# Altium footprint library microbuilder.PCBLIB: 422 footprints (part 20 of 27)
Each footprint in its own frame and in the unit in brackets; x right, y up, seen from the top. Pads: shape width x height; smd on the part's side, far side on the other; paste and mask are expansions set on the pad; w line width, h text height; cw(c..) or ccw(c..) is an arc to the next point about the centre after c.
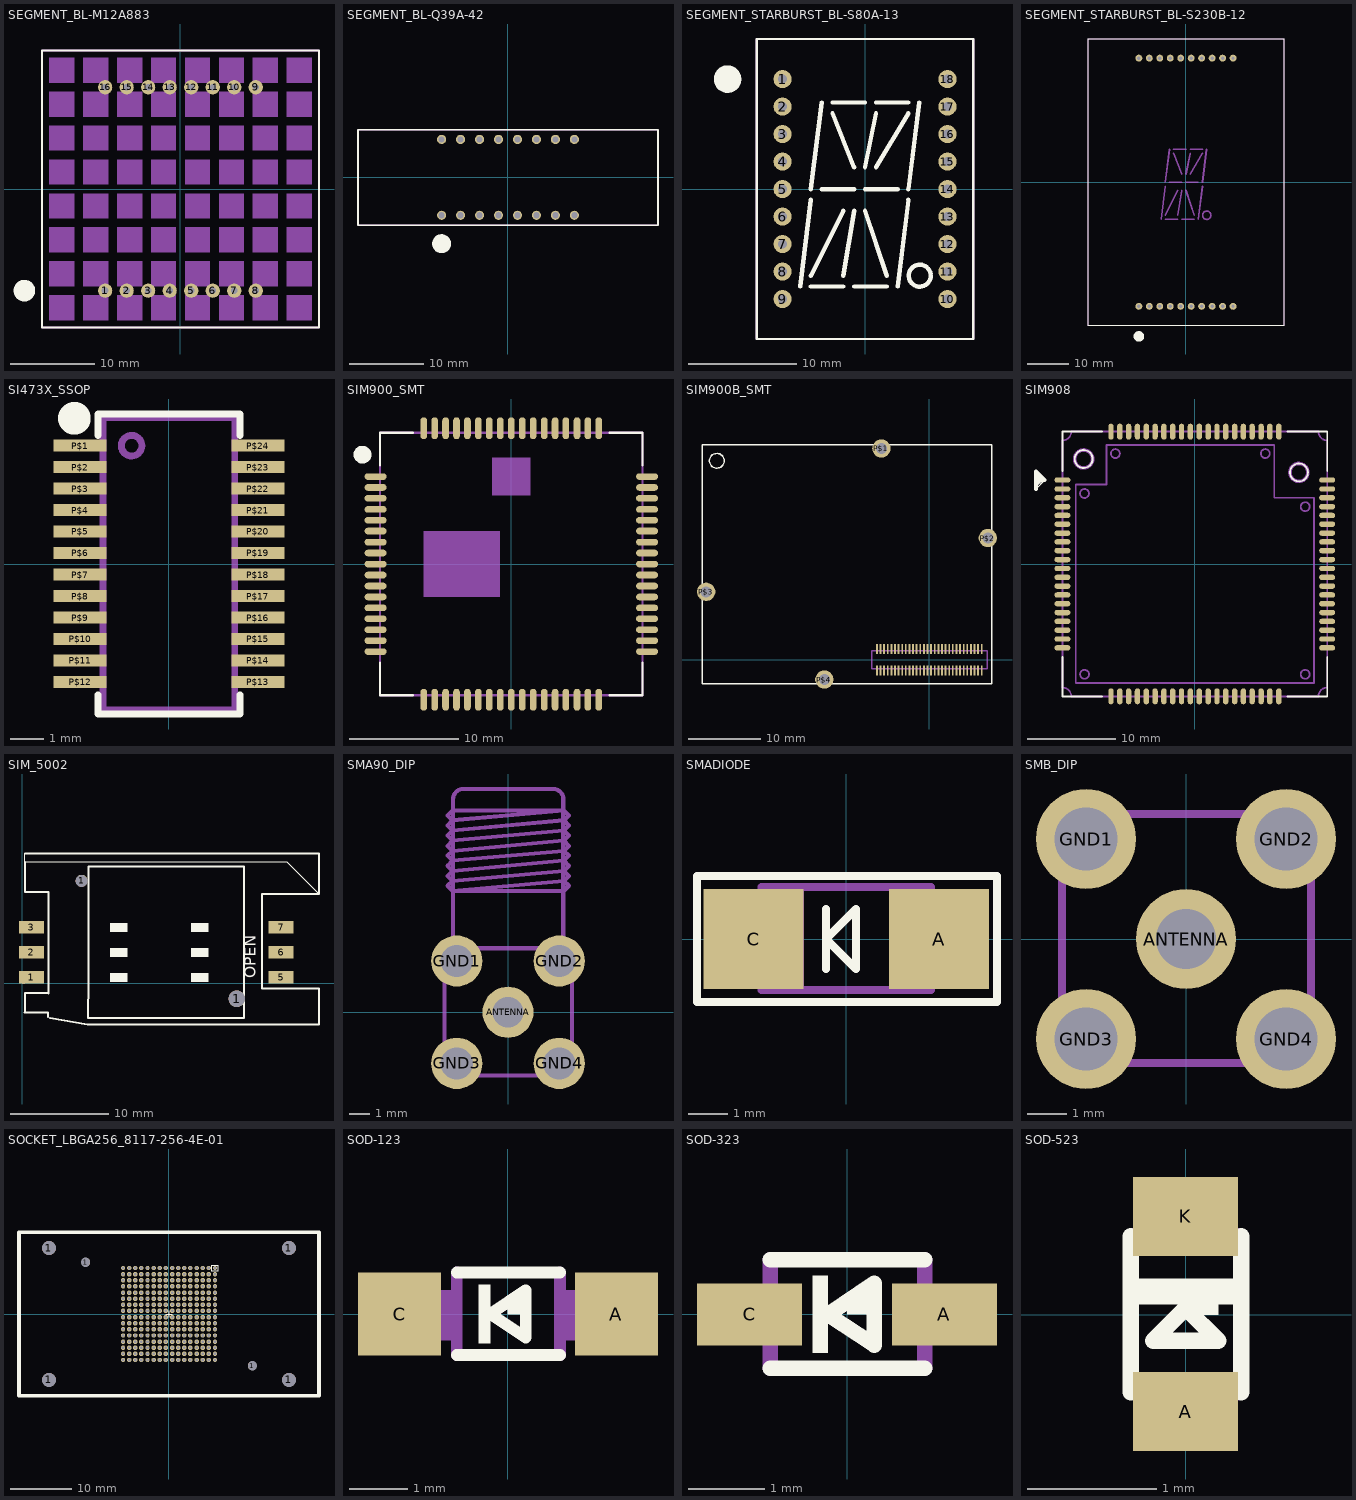
[diagram p19: the footprints below, top view; thin cyan lines are the x and y axes]

## SEGMENT_BL-M12A883 [mil]
pads (16):
  round 66 hole 32: 1(-350,-472.44) 2(-250,-472.44) 3(-150,-472.44) 4(-50,-472.44) 5(50,-472.44) 6(150,-472.44) 7(250,-472.44) 8(350,-472.44) 9(350,473) 10(250,473) 11(150,473) 12(50,473) 13(-50,473) 14(-150,473) 15(-250,473) 16(-350,473)
Top Overlay:
  circle w50: c-725.59,-472.44 r25
  lines w8: -643.7,-643.7 644,-643.7 644,644 -643.7,644 -643.7,-643.7
Mechanical 16:
  rectangle: -610.24,493 -492.13,611
  rectangle: -452.76,493 -334.65,611
  rectangle: -295.28,493 -177.17,611
  rectangle: -137.8,493 -19.68,611
  rectangle: 20,493 138,611
  rectangle: 178,493 296,611
  rectangle: 335,493 453,611
  rectangle: 493,493 611,611
  rectangle: 493,335 611,453
  rectangle: 335,335 453,453
  rectangle: 178,335 296,453
  rectangle: 20,335 138,453
  rectangle: -137.8,335 -19.68,453
  rectangle: -295.28,335 -177.17,453
  rectangle: -610.24,335 -492.13,453
  rectangle: -452.76,335 -334.65,453
  rectangle: -610.24,178 -492.13,296
  rectangle: -452.76,178 -334.65,296
  rectangle: -295.28,178 -177.17,296
  rectangle: -137.8,178 -19.68,296
  rectangle: 20,178 138,296
  rectangle: 178,178 296,296
  rectangle: 335,178 453,296
  rectangle: 493,178 611,296
  rectangle: 493,20 611,138
  rectangle: 493,-137.8 611,-19.68
  rectangle: 335,-137.8 453,-19.68
  rectangle: 335,20 453,138
  rectangle: 178,20 296,138
  rectangle: 20,20 138,138
  rectangle: -137.8,20 -19.68,138
  rectangle: -295.28,20 -177.17,138
  rectangle: -452.76,20 -334.65,138
  rectangle: -610.24,20 -492.13,138
  rectangle: -610.24,-137.8 -492.13,-19.68
  rectangle: -452.76,-137.8 -334.65,-19.68
  rectangle: -295.28,-137.8 -177.17,-19.68
  rectangle: -137.8,-137.8 -19.68,-19.68
  rectangle: 20,-137.8 138,-19.68
  rectangle: 178,-137.8 296,-19.68
  rectangle: 493,-295.28 611,-177.17
  rectangle: 335,-295.28 453,-177.17
  rectangle: -610.24,-295.28 -492.13,-177.17
  rectangle: -452.76,-295.28 -334.65,-177.17
  rectangle: -295.28,-295.28 -177.17,-177.17
  rectangle: -137.8,-295.28 -19.68,-177.17
  rectangle: 20,-295.28 138,-177.17
  rectangle: 178,-295.28 296,-177.17
  rectangle: 493,-452.76 611,-334.65
  rectangle: 335,-452.76 453,-334.65
  rectangle: -610.24,-452.76 -492.13,-334.65
  rectangle: -452.76,-452.76 -334.65,-334.65
  rectangle: -295.28,-452.76 -177.17,-334.65
  rectangle: -137.8,-452.76 -19.68,-334.65
  rectangle: 20,-452.76 138,-334.65
  rectangle: 178,-452.76 296,-334.65
  rectangle: 493,-610.24 611,-492.13
  rectangle: 335,-610.24 453,-492.13
  rectangle: -610.24,-610.24 -492.13,-492.13
  rectangle: -452.76,-610.24 -334.65,-492.13
  rectangle: -295.28,-610.24 -177.17,-492.13
  rectangle: -137.8,-610.24 -19.68,-492.13
  rectangle: 20,-610.24 138,-492.13
  rectangle: 178,-610.24 296,-492.13
  lines w8: -643.7,-643.7 644,-643.7 644,644 -643.7,644 -643.7,-643.7

## SEGMENT_BL-Q39A-42 [mil]
pads (16):
  round 48 hole 32: P$1(-350,-200) P$2(-250,-200) P$3(-150,-200) P$4(-50,-200) P$5(50,-200) P$6(150,-200) P$7(250,-200) P$8(350,-200) P$9(350,200) P$10(250,200) P$11(150,200) P$12(50,200) P$13(-50,200) P$14(-150,200) P$15(-250,200) P$16(-350,200)
Top Overlay:
  circle w50: c-350,-350 r25
  lines w8: -790.94,-251.97 791,-251.97 791,252 -790.94,252 -790.94,-251.97
Mechanical 16:
  lines w5: -790.94,-251.97 791,-251.97 791,252 -790.94,252 -790.94,-251.97

## SEGMENT_STARBURST_BL-S80A-13 [mil]
pads (18):
  round 66 hole 32: 1(-300,400) 2(-300,300) 3(-300,200) 4(-300,100) 5(-300,0) 6(-300,-100) 7(-300,-200) 8(-300,-300) 9(-300,-400) 10(300,-400) 11(300,-300) 12(300,-200) 13(300,-100) 14(300,0) 15(300,100) 16(300,200) 17(300,300) 18(300,400)
Top Overlay:
  circle w16: c199,-314.96 r40
  circle w50: c-500,400 r25
  lines w8: -393.7,-545.28 394,-545.28 394,546 -393.7,546 -393.7,-545.28
  lines w16: -236.22,-354.33 -196.85,-39.37 ; -196.85,-354.33 -78.74,-354.33 ; -196.85,-314.96 -78.74,-78.74 ; -196.85,0 -157.48,315 ; -157.48,0 -39.37,0 ; -118.11,276 -39.37,79 ; -118.11,315 0,315 ; -78.74,-314.96 -39.37,-78.74 ; -39.37,-354.33 79,-354.33 ; 0,-78.74 79,-314.96 ; 0,0 119,0 ; 0,79 40,276 ; 40,79 158,276 ; 40,315 158,315 ; 119,-354.33 158,-39.37 ; 158,0 197,315
Mechanical 16:
  lines w8: -393.7,-545.28 394,-545.28 394,546 -393.7,546 -393.7,-545.28
  text "A1" at -78.74,335 h62
  text "A2" at 79,335 h62
  text "D1" at -177.17,-413.39 h62
  text "D2" at -19.68,-413.39 h62
  text "E" at -275.59,-196.85 h62
  text "F" at -236.22,158 h62
  text "B" at 217,158 h62
  text "C" at 178,-196.85 h62
  text "G1" at -118.11,20 h62
  text "G2" at 40,20 h62
  text "L" at 40,-118.11 h62
  text "M" at -39.37,-236.22 h62
  text "N" at -137.8,-118.11 h62
  text "J" at -19.68,197 h62
  text "K" at 119,138 h62
  text "H" at -118.11,138 h62
  text "DP" at 167,-413.39 h62

## SEGMENT_STARBURST_BL-S230B-12 [mil]
pads (20):
  round 66 hole 32: 1(-450,-1185.04) 2(-350,-1185.04) 3(-250,-1185.04) 4(-150,-1185.04) 5(-50,-1185.04) 6(50,-1185.04) 7(150,-1185.04) 8(250,-1185.04) 9(350,-1185.04) 10(450,-1185.04) 11(450,1186) 12(350,1186) 13(250,1186) 14(150,1186) 15(50,1186) 16(-50,1186) 17(-150,1186) 18(-250,1186) 19(-350,1186) 20(-450,1186)
Top Overlay:
  circle w50: c-450,-1472.44 r25
  lines w8: -937.01,-1368.11 -937.01,1369 938,1369 938,-1368.11 -937.01,-1368.11
Mechanical 16:
  circle w16: c199,-314.96 r40
  lines w8: -937.01,-1368.11 -937.01,1369 938,1369 938,-1368.11 -937.01,-1368.11
  lines w16: -236.22,-354.33 -196.85,-39.37 ; -196.85,-354.33 -78.74,-354.33 ; -196.85,-314.96 -78.74,-78.74 ; -196.85,0 -157.48,315 ; -157.48,0 -39.37,0 ; -118.11,276 -39.37,79 ; -118.11,315 0,315 ; -78.74,-314.96 -39.37,-78.74 ; -39.37,-354.33 79,-354.33 ; 0,-78.74 79,-314.96 ; 0,0 119,0 ; 0,79 40,276 ; 40,79 158,276 ; 40,315 158,315 ; 119,-354.33 158,-39.37 ; 158,0 197,315
  text "A1" at -78.74,335 h62
  text "A2" at 79,335 h62
  text "D1" at -177.17,-413.39 h62
  text "D2" at -19.68,-413.39 h62
  text "F" at -236.22,158 h62
  text "B" at 217,158 h62
  text "C" at 178,-196.85 h62
  text "G1" at -118.11,20 h62
  text "G2" at 40,20 h62
  text "L" at 40,-118.11 h62
  text "M" at -39.37,-236.22 h62
  text "N" at -137.8,-118.11 h62
  text "J" at -19.68,197 h62
  text "K" at 119,138 h62
  text "H" at -118.11,138 h62
  text "DP" at 167,-413.39 h62

## SI473X_SSOP [mil]
pads (24):
  rect 62x14 smd: P$1(-103.35,138) P$2(-103.35,113) P$3(-103.35,88) P$4(-103.35,63) P$5(-103.35,38) P$6(-103.35,13) P$7(-103.35,-12.5) P$8(-103.35,-37.5) P$9(-103.35,-62.5) P$10(-103.35,-87.5) P$11(-103.35,-112.5) P$12(-103.35,-137.5) P$13(104,-137.5) P$14(104,-112.5) P$15(104,-87.5) P$16(104,-62.5) P$17(104,-37.5) P$18(104,-12.5) P$19(104,13) P$20(104,38) P$21(104,63) P$22(104,88) P$23(104,113) P$24(104,138)
Top Overlay:
  circle w32: c-110,170 r3
  lines w8: -82.5,-152.5 -82.5,-175 83,-175 83,-152.5 ; -82.5,150 -82.5,175 -80,175 83,175 83,150
Mechanical 16:
  circle w8: c-43.31,138 r12
  lines w8: -76.77,-170.28 77,-170.28 77,171 -76.77,171 -76.77,-170.28

## SIM900_SMT [mil]
pads (68):
  rrect100% 79x24 smd: P$1(-488.19,315) P$2(-488.19,276) P$3(-488.19,237) P$4(-488.19,197) P$5(-488.19,158) P$6(-488.19,119) P$7(-488.19,79) P$8(-488.19,40) P$9(-488.19,0) P$10(-488.19,-39.37) P$11(-488.19,-78.74) P$12(-488.19,-118.11) P$13(-488.19,-157.48) P$14(-488.19,-196.85) P$15(-488.19,-236.22) P$16(-488.19,-275.59) P$17(-488.19,-314.96) P$35(489,-314.96) P$36(489,-275.59) P$37(489,-236.22) P$38(489,-196.85) P$39(489,-157.48) P$40(489,-118.11) P$41(489,-78.74) P$42(489,-39.37) P$43(489,0) P$44(489,40) P$45(489,79) P$46(489,119) P$47(489,158) P$48(489,197) P$49(489,237) P$50(489,276) P$51(489,315)
  rrect100% 24x79 smd: P$18(-314.96,-488.19) P$19(-275.59,-488.19) P$20(-236.22,-488.19) P$21(-196.85,-488.19) P$22(-157.48,-488.19) P$23(-118.11,-488.19) P$24(-78.74,-488.19) P$25(-39.37,-488.19) P$26(0,-488.19) P$27(40,-488.19) P$28(79,-488.19) P$29(119,-488.19) P$30(158,-488.19) P$31(197,-488.19) P$32(237,-488.19) P$33(276,-488.19) P$34(315,-488.19) P$52(315,489) P$53(276,489) P$54(237,489) P$55(197,489) P$56(158,489) P$57(119,489) P$58(79,489) P$59(40,489) P$60(0,489) P$61(-39.37,489) P$62(-78.74,489) P$63(-118.11,489) P$64(-157.48,489) P$65(-196.85,489) P$66(-236.22,489) P$67(-275.59,489) P$68(-314.96,489)
Top Overlay:
  circle w32: c-535.43,394 r16
  lines w8: -472.44,-354.33 -472.44,-472.44 -354.33,-472.44 ; -472.44,355 -472.44,473 -354.33,473 ; 355,-472.44 473,-472.44 473,-354.33 ; 355,473 473,473 473,355
Mechanical 16:
  lines w8: -472.44,-472.44 -472.44,473 473,473 473,-472.44 -472.44,-472.44
Mechanical 27:
  rectangle: -314.96,-118.11 -39.37,119
  rectangle: -68.9,247 69,384

## SIM900B_SMT [mil]
pads (64):
  rect 10x54 smd: 1(-285.43,-58.07) 2(-285.43,59) 3(-265.75,-58.07) 4(-265.75,59) 5(-246.06,-58.07) 6(-246.06,59) 7(-226.38,-58.07) 8(-226.38,59) 9(-206.69,-58.07) 10(-206.69,59) 11(-187.01,-58.07) 12(-187.01,59) 13(-167.32,-58.07) 14(-167.32,59) 15(-147.64,-58.07) 16(-147.64,59) 17(-127.95,-58.07) 18(-127.95,59) 19(-108.27,-58.07) 20(-108.27,59) 21(-88.58,-58.07) 22(-88.58,59) 23(-68.9,-58.07) 24(-68.9,59) 25(-49.21,-58.07) 26(-49.21,59) 27(-29.53,-58.07) 28(-29.53,59) 29(-9.84,-58.07) 30(-9.84,59) 31(10,-58.07) 32(10,59) 33(30,-58.07) 34(30,59) 35(50,-58.07) 36(50,59) 37(69,-58.07) 38(69,59) 39(89,-58.07) 40(89,59) 41(109,-58.07) 42(109,59) 43(128,-58.07) 44(128,59) 45(148,-58.07) 46(148,59) 47(168,-58.07) 48(168,59) 49(188,-58.07) 50(188,59) 51(207,-58.07) 52(207,59) 53(227,-58.07) 54(227,59) 55(247,-58.07) 56(247,59) 57(266,-58.07) 58(266,59) 59(286,-58.07) 60(286,59)
  round 100 hole 60: P$1(-261.02,1152) P$2(319,664) P$3(-1216.14,371) P$4(-572.05,-107.09)
Top Overlay:
  circle w8: c-1158.27,1085 r40
  lines w8: -1238.19,-131.5 341,-131.5 341,1172 -1238.19,1172 -1238.19,-131.5
Mechanical 16:
  lines w8: -314.96,-49.21 315,-49.21 315,50 -314.96,50 -314.96,-49.21

## SIM908 [mil]
pads (80):
  rrect100% 71x24 smd: P$1(-590.55,375) P$2(-590.55,335) P$3(-590.55,296) P$4(-590.55,256) P$5(-590.55,217) P$6(-590.55,178) P$7(-590.55,138) P$8(-590.55,99) P$9(-590.55,60) P$10(-590.55,20) P$11(-590.55,-19.68) P$12(-590.55,-59.06) P$13(-590.55,-98.43) P$14(-590.55,-137.8) P$15(-590.55,-177.17) P$16(-590.55,-216.54) P$17(-590.55,-255.91) P$18(-590.55,-295.28) P$19(-590.55,-334.65) P$20(-590.55,-374.02) P$41(591,-374.02) P$42(591,-334.65) P$43(591,-295.28) P$44(591,-255.91) P$45(591,-216.54) P$46(591,-177.17) P$47(591,-137.8) P$48(591,-98.43) P$49(591,-59.06) P$50(591,-19.68) P$51(591,20) P$52(591,60) P$53(591,99) P$54(591,138) P$55(591,178) P$56(591,217) P$57(591,256) P$58(591,296) P$59(591,335) P$60(591,375)
  rrect100% 24x71 smd: P$21(-374.02,-590.55) P$22(-334.65,-590.55) P$23(-295.28,-590.55) P$24(-255.91,-590.55) P$25(-216.54,-590.55) P$26(-177.17,-590.55) P$27(-137.8,-590.55) P$28(-98.43,-590.55) P$29(-59.06,-590.55) P$30(-19.68,-590.55) P$31(20,-590.55) P$32(60,-590.55) P$33(99,-590.55) P$34(138,-590.55) P$35(178,-590.55) P$36(217,-590.55) P$37(256,-590.55) P$38(296,-590.55) P$39(335,-590.55) P$40(375,-590.55) P$61(375,591) P$62(335,591) P$63(296,591) P$64(256,591) P$65(217,591) P$66(178,591) P$67(138,591) P$68(99,591) P$69(60,591) P$70(20,591) P$71(-19.68,591) P$72(-59.06,591) P$73(-98.43,591) P$74(-137.8,591) P$75(-177.17,591) P$76(-216.54,591) P$77(-255.91,591) P$78(-295.28,591) P$79(-334.65,591) P$80(-374.02,591)
Top Overlay:
  circle w8: c-496.06,469 r40
  circle w8: c465,409 r40
  lines w8: -708.66,335 -669.29,375 ; -590.55,-413.39 -590.55,-590.55 -413.39,-590.55 ; -590.55,414 -590.55,591 -413.39,591 ; 414,-590.55 591,-590.55 591,-413.39 ; 414,591 591,591 591,414
  lines w16: -708.66,335 -708.66,355 ; -708.66,355 -688.98,375 ; -708.66,355 -708.66,394 ; -708.66,394 -708.66,414 -669.29,375 -688.98,375 ; -708.66,394 -688.98,375
Mechanical 16:
  circle w8: c-492.13,315 r20
  circle w8: c-354.33,493 r20
  circle w8: c315,493 r20
  circle w8: c493,256 r20
  circle w8: c-492.13,-492.13 r20
  circle w8: c493,-492.13 r20
  circle w16: c-496.06,469 r40
  circle w16: c465,409 r40
  lines w8: -590.55,-551.18 -590.55,552 ccw(c-590.37,591.18) -551.18,591 552,591 ccw(c591,591) 591,552 591,-551.18 ccw(c591.18,-590.37) 552,-590.55 -551.18,-590.55 ccw(c-590.55,-590.55) -590.55,-551.18 ; -531.5,-531.5 532,-531.5 532,296 355,296 355,532 -393.7,532 -393.7,355 -531.5,355 -531.5,-531.5

## SIM_5002 [mil]
pads (8):
  rect 100x50 smd: 1(36,23) 2(36,123) 3(36,223) 5(1036,24) 6(1036,124) 7(1036,224)
  round 48 hole 48: 1(237,410)
  round 67 hole 67: 1(859,-62.99)
Top Overlay:
  rectangle: 351,5 421,40
  rectangle: 351,105 421,140
  rectangle: 351,205 421,240
  rectangle: 676,5 746,40
  rectangle: 676,105 746,140
  rectangle: 676,205 746,240
  region: 0,0 10,0 10,10 0,10
  region: 0,0 10,0 10,10 0,10
  region: 0,0 10,0 10,10 0,10
  lines w5: 10,519 10,485 1060,485 1185,360
  lines w8: 9,-117.94 103,-117.68 103,-136.17 ; 10,-115 10,-40 105,-40 ; 10,485 10,365 105,365 105,13 105,-40 ; 10,519 64,519 ; 63,519 1025,519 1187,519 ; 105,-41.11 105,-40 ; 110,-140 260,-165 1188,-165 ; 960,10 960,358 1188,358 1188,519 ; 960,14 960,-21.12 1188,-21.12 1188,-165.54 ; 263,-139.25 264,11 264,468 887,468 887,-140 263,-139.25
  text "OPEN" at 950,19 h77.5

## SMA90_DIP [mil]
pads (5):
  round 100 hole 60: ANTENNA(0,0)
  round 100 hole 63: GND1(-100,100) GND2(100,100) GND3(-100,-100) GND4(100,-100)
Mechanical 16:
  lines w8: -107.28,125 -107.28,416 ; -107.09,416 cw(c-87.54,416.45) -87.99,436 ; -87.6,436 88,436 ; 89,436 cw(c88.5,416.5) 108,416 108,125 ; -108.27,237 -118.11,247 -108.27,256 ; -108.27,237 109,256 ; -108.27,237 109,237 119,247 109,256 ; -108.27,256 -118.11,266 -108.27,276 ; -108.27,256 109,276 ; -108.27,276 -118.11,286 -108.27,296 ; -108.27,276 109,296 ; -108.27,296 -118.11,306 -108.27,315 ; -108.27,296 109,315 ; -108.27,315 -118.11,325 -108.27,335 ; -108.27,315 109,335 ; -108.27,335 -118.11,345 -108.27,355 ; -108.27,335 109,355 ; -108.27,355 -118.11,365 -108.27,375 ; -108.27,355 109,375 ; -108.27,375 -118.11,384 -108.27,394 109,394 ; -108.27,375 109,394 ; 109,256 119,266 109,276 ; 109,276 119,286 109,296 ; 109,296 119,306 109,315 ; 109,315 119,325 109,335 ; 109,335 119,345 109,355 ; 109,355 119,365 109,375 ; 109,375 119,384 109,394 ; -124.02,-99.21 ccw(c-99.21,-99.21) -99.21,-124.02 100,-124.02 ccw(c100.1,-99.11) 125,-99.21 125,100 ccw(c100,100) 100,125 -99.21,125 ccw(c-99.11,100.1) -124.02,100 -124.02,-99.21

## SMADIODE [mil]
pads (2):
  rect 100x100 smd: A(93,0) C(-92.5,0)
Top Overlay:
  lines w5: -149.17,-54.88 -149.17,-45.12 ; 151,53 151,55
  lines w8: -20,-30 -20,0 ; -20,30 -20,0 ; -20,0 10,-30 10,30 -20,0 ; -149.17,-62.99 151,-62.99 151,55 151,63 -149.17,63 -149.17,-45.12 -149.17,-62.99
Mechanical 16:
  rectangle: -111.22,-43.31 -85.63,44
  region: 112,44 86,44 86,-43.31 112,-43.31
  rectangle: -68.9,-48.23 -42.32,49
  lines w8: -84.65,-51.18 85,-51.18 85,52 -84.65,52 -84.65,-51.18

## SMB_DIP [mil]
pads (5):
  round 100 hole 60: ANTENNA(0,0)
  round 100 hole 63: GND1(-100,100) GND2(100,100) GND3(-100,-100) GND4(100,-100)
Mechanical 16:
  lines w8: -124.02,-99.21 ccw(c-99.21,-99.21) -99.21,-124.02 100,-124.02 ccw(c100.1,-99.11) 125,-99.21 125,100 ccw(c100,100) 100,125 -99.21,125 ccw(c-99.11,100.1) -124.02,100 -124.02,-99.21

## SOCKET_LBGA256_8117-256-4E-01 [mil]
pads (262):
  round 89 hole 89: 1(-771.65,-423.23) 1(-771.65,424) 1(772,-423.23) 1(772,424)
  round 58 hole 58: 1(-535.43,333) 1(536,-332.68)
  oct 28x28 hole 17: A1(296,296) A2(296,256) A3(296,217) A4(296,178) A5(296,138) A6(296,99) A7(296,60) A8(296,20) A9(296,-19.68) A10(296,-59.06) A11(296,-98.43) A12(296,-137.8) A13(296,-177.17) A14(296,-216.54) A15(296,-255.91) A16(296,-295.28) B1(256,296) B2(256,256) B3(256,217) B4(256,178) B5(256,138) B6(256,99) B7(256,60) B8(256,20) B9(256,-19.68) B10(256,-59.06) B11(256,-98.43) B12(256,-137.8) B13(256,-177.17) B14(256,-216.54) B15(256,-255.91) B16(256,-295.28) C1(217,296) C2(217,256) C3(217,217) C4(217,178) C5(217,138) C6(217,99) C7(217,60) C8(217,20) C9(217,-19.68) C10(217,-59.06) C11(217,-98.43) C12(217,-137.8) C13(217,-177.17) C14(217,-216.54) C15(217,-255.91) C16(217,-295.28) D1(178,296) D2(178,256) D3(178,217) D4(178,178) D5(178,138) D6(178,99) D7(178,60) D8(178,20) D9(178,-19.68) D10(178,-59.06) D11(178,-98.43) D12(178,-137.8) D13(178,-177.17) D14(178,-216.54) D15(178,-255.91) D16(178,-295.28) E1(138,296) E2(138,256) E3(138,217) E4(138,178) E5(138,138) E6(138,99) E7(138,60) E8(138,20) E9(138,-19.68) E10(138,-59.06) E11(138,-98.43) E12(138,-137.8) E13(138,-177.17) E14(138,-216.54) E15(138,-255.91) E16(138,-295.28) F1(99,296) F2(99,256) F3(99,217) F4(99,178) F5(99,138) F6(99,99) F7(99,60) F8(99,20) F9(99,-19.68) F10(99,-59.06) F11(99,-98.43) F12(99,-137.8) F13(99,-177.17) F14(99,-216.54) F15(99,-255.91) F16(99,-295.28) G1(60,296) G2(60,256) G3(60,217) G4(60,178) G5(60,138) G6(60,99) G7(60,60) G8(60,20) G9(60,-19.68) G10(60,-59.06) G11(60,-98.43) G12(60,-137.8) G13(60,-177.17) G14(60,-216.54) G15(60,-255.91) G16(60,-295.28) H1(20,296) H2(20,256) H3(20,217) H4(20,178) H5(20,138) H6(20,99) H7(20,60) H8(20,20) H9(20,-19.68) H10(20,-59.06) H11(20,-98.43) H12(20,-137.8) H13(20,-177.17) H14(20,-216.54) H15(20,-255.91) H16(20,-295.28) J1(-19.68,296) J2(-19.68,256) J3(-19.68,217) J4(-19.68,178) J5(-19.68,138) J6(-19.68,99) J7(-19.68,60) J8(-19.68,20) J9(-19.68,-19.68) J10(-19.68,-59.06) J11(-19.68,-98.43) J12(-19.68,-137.8) J13(-19.68,-177.17) J14(-19.68,-216.54) J15(-19.68,-255.91) J16(-19.68,-295.28) K1(-59.06,296) K2(-59.06,256) K3(-59.06,217) K4(-59.06,178) K5(-59.06,138) K6(-59.06,99) K7(-59.06,60) K8(-59.06,20) K9(-59.06,-19.68) K10(-59.06,-59.06) K11(-59.06,-98.43) K12(-59.06,-137.8) K13(-59.06,-177.17) K14(-59.06,-216.54) K15(-59.06,-255.91) K16(-59.06,-295.28) L1(-98.43,296) L2(-98.43,256) L3(-98.43,217) L4(-98.43,178) L5(-98.43,138) L6(-98.43,99) L7(-98.43,60) L8(-98.43,20) L9(-98.43,-19.68) L10(-98.43,-59.06) L11(-98.43,-98.43) L12(-98.43,-137.8) L13(-98.43,-177.17) L14(-98.43,-216.54) L15(-98.43,-255.91) L16(-98.43,-295.28) M1(-137.8,296) M2(-137.8,256) M3(-137.8,217) M4(-137.8,178) M5(-137.8,138) M6(-137.8,99) M7(-137.8,60) M8(-137.8,20) M9(-137.8,-19.68) M10(-137.8,-59.06) M11(-137.8,-98.43) M12(-137.8,-137.8) M13(-137.8,-177.17) M14(-137.8,-216.54) M15(-137.8,-255.91) M16(-137.8,-295.28) N1(-177.17,296) N2(-177.17,256) N3(-177.17,217) N4(-177.17,178) N5(-177.17,138) N6(-177.17,99) N7(-177.17,60) N8(-177.17,20) N9(-177.17,-19.68) N10(-177.17,-59.06) N11(-177.17,-98.43) N12(-177.17,-137.8) N13(-177.17,-177.17) N14(-177.17,-216.54) N15(-177.17,-255.91) N16(-177.17,-295.28) P1(-216.54,296) P2(-216.54,256) P3(-216.54,217) P4(-216.54,178) P5(-216.54,138) P6(-216.54,99) P7(-216.54,60) P8(-216.54,20) P9(-216.54,-19.68) P10(-216.54,-59.06) P11(-216.54,-98.43) P12(-216.54,-137.8) P13(-216.54,-177.17) P14(-216.54,-216.54) P15(-216.54,-255.91) P16(-216.54,-295.28) R1(-255.91,296) R2(-255.91,256) R3(-255.91,217) R4(-255.91,178) R5(-255.91,138) R6(-255.91,99) R7(-255.91,60) R8(-255.91,20) R9(-255.91,-19.68) R10(-255.91,-59.06) R11(-255.91,-98.43) R12(-255.91,-137.8) R13(-255.91,-177.17) R14(-255.91,-216.54) R15(-255.91,-255.91) R16(-255.91,-295.28) T1(-295.28,296) T2(-295.28,256) T3(-295.28,217) T4(-295.28,178) T5(-295.28,138) T6(-295.28,99) T7(-295.28,60) T8(-295.28,20) T9(-295.28,-19.68) T10(-295.28,-59.06) T11(-295.28,-98.43) T12(-295.28,-137.8) T13(-295.28,-177.17) T14(-295.28,-216.54) T15(-295.28,-255.91) T16(-295.28,-295.28)
Top Overlay:
  lines w2: -19.68,0 20,0 ; 0,-19.68 0,20 ; 276,276 315,276 315,315 276,315 276,276
  lines w24: -964.57,-525.59 -964.57,526 965,526 965,-525.59 -964.57,-525.59
Bottom Overlay:
  lines w10: -295.28,-393.7 -295.28,-314.96 ; -255.91,-334.65 -255.91,-314.96 ; -216.54,-393.7 -216.54,-314.96 ; -177.17,-334.65 -177.17,-314.96 ; -137.8,-393.7 -137.8,-314.96 ; -98.43,-334.65 -98.43,-314.96 ; -59.06,-393.7 -59.06,-314.96 ; -19.68,-334.65 -19.68,-314.96 ; 20,-393.7 20,-314.96 ; 60,-334.65 60,-314.96 ; 99,-393.7 99,-314.96 ; 138,-334.65 138,-314.96 ; 178,-393.7 178,-314.96 ; 217,-334.65 217,-314.96 ; 256,-393.7 256,-314.96 ; 296,-334.65 296,-314.96 ; 315,-295.28 394,-295.28 ; 315,-255.91 335,-255.91 ; 315,-216.54 394,-216.54 ; 315,-177.17 335,-177.17 ; 315,-137.8 394,-137.8 ; 315,-98.43 335,-98.43 ; 315,-59.06 394,-59.06 ; 315,-19.68 335,-19.68 ; 315,20 394,20 ; 315,60 335,60 ; 315,99 394,99 ; 315,138 335,138 ; 315,178 394,178 ; 315,217 335,217 ; 315,256 394,256 ; 315,296 335,296
  text "A" at 315,-393.7 h62
  text "B" at 276,-452.76 h62
  text "C" at 237,-393.7 h62
  text "D" at 197,-452.76 h62
  text "E" at 158,-393.7 h62
  text "F" at 119,-452.76 h62
  text "G" at 79,-393.7 h62
  text "H" at 40,-452.76 h62
  text "J" at 0,-393.7 h62
  text "K" at -39.37,-452.76 h62
  text "L" at -78.74,-393.7 h62
  text "M" at -118.11,-452.76 h62
  text "N" at -157.48,-393.7 h62
  text "P" at -196.85,-452.76 h62
  text "R" at -236.22,-393.7 h62
  text "T" at -275.59,-452.76 h62
  text "16" at 473,-314.96 h62
  text "15" at 414,-275.59 h62
  text "14" at 473,-236.22 h62
  text "13" at 414,-196.85 h62
  text "12" at 473,-157.48 h62
  text "11" at 414,-118.11 h62
  text "10" at 473,-78.74 h62
  text "9" at 375,-39.37 h62
  text "8" at 434,0 h62
  text "7" at 375,40 h62
  text "6" at 434,79 h62
  text "5" at 375,119 h62
  text "4" at 434,158 h62
  text "3" at 375,197 h62
  text "2" at 434,237 h62
  text "1" at 375,276 h62

## SOD-123 [mil]
pads (2):
  rect 56x56 smd: A(73,0) C(-72.83,0)
Top Overlay:
  rectangle: -19.68,-19.68 -11.81,20
  region: 0,0 10,0 10,10 0,10
  lines w8: -34.37,-27.56 35,-27.56 ; -34.37,28 35,28 ; -11.81,0 12,16 12,-15.75 -11.81,0
Mechanical 16:
  rectangle: -67.83,-17.72 -38.31,16
  rectangle: 39,-17.72 68,16
  lines w8: -34.37,-27.56 -34.37,28 ; 35,-27.56 35,28

## SOD-323 [mil]
pads (2):
  rect 54x32 smd: A(50,0) C(-50,0)
Top Overlay:
  rectangle: -17.72,-19.68 -9.84,20
  region: 0,0 10,0 10,10 0,10
  lines w8: -39.37,-27.56 40,-27.56 ; -39.37,28 40,28 ; -9.84,0 14,16 14,-15.75 -9.84,0
Mechanical 16:
  lines w8: -39.37,-27.56 -39.37,28 ; 40,-27.56 40,28

## SOD-523 [mil]
pads (2):
  rect 32x24 smd: A(0,-29.53) K(0,30)
Top Overlay:
  region: -15.91,11.03 -15.91,3.09 15.97,3.09 15.97,11.03
  region: 0,0 10,0 10,10 0,10
  lines w5: -16.75,-23.62 -16.75,24 ; 17,-23.62 17,24 ; -9.84,-7.87 10,-7.87 0,2 -9.84,-7.87
Mechanical 16:
  region: -7.97,29.97 -7.97,22.03 8.03,22.03 8.03,29.97
  region: -7.84,-21.62 -7.84,-29.56 7.91,-29.56 7.91,-21.62
  lines w5: -15.75,-23.62 16,-23.62 ; -15.75,24 16,24